# Altium footprint library INDUCTORS.PcbLib: 15 footprints
Each footprint in its own frame and in the unit in brackets; x right, y up, seen from the top. Pads: shape width x height; smd on the part's side, far side on the other; paste and mask are expansions set on the pad; w line width, h text height; cw(c..) or ccw(c..) is an arc to the next point about the centre after c.
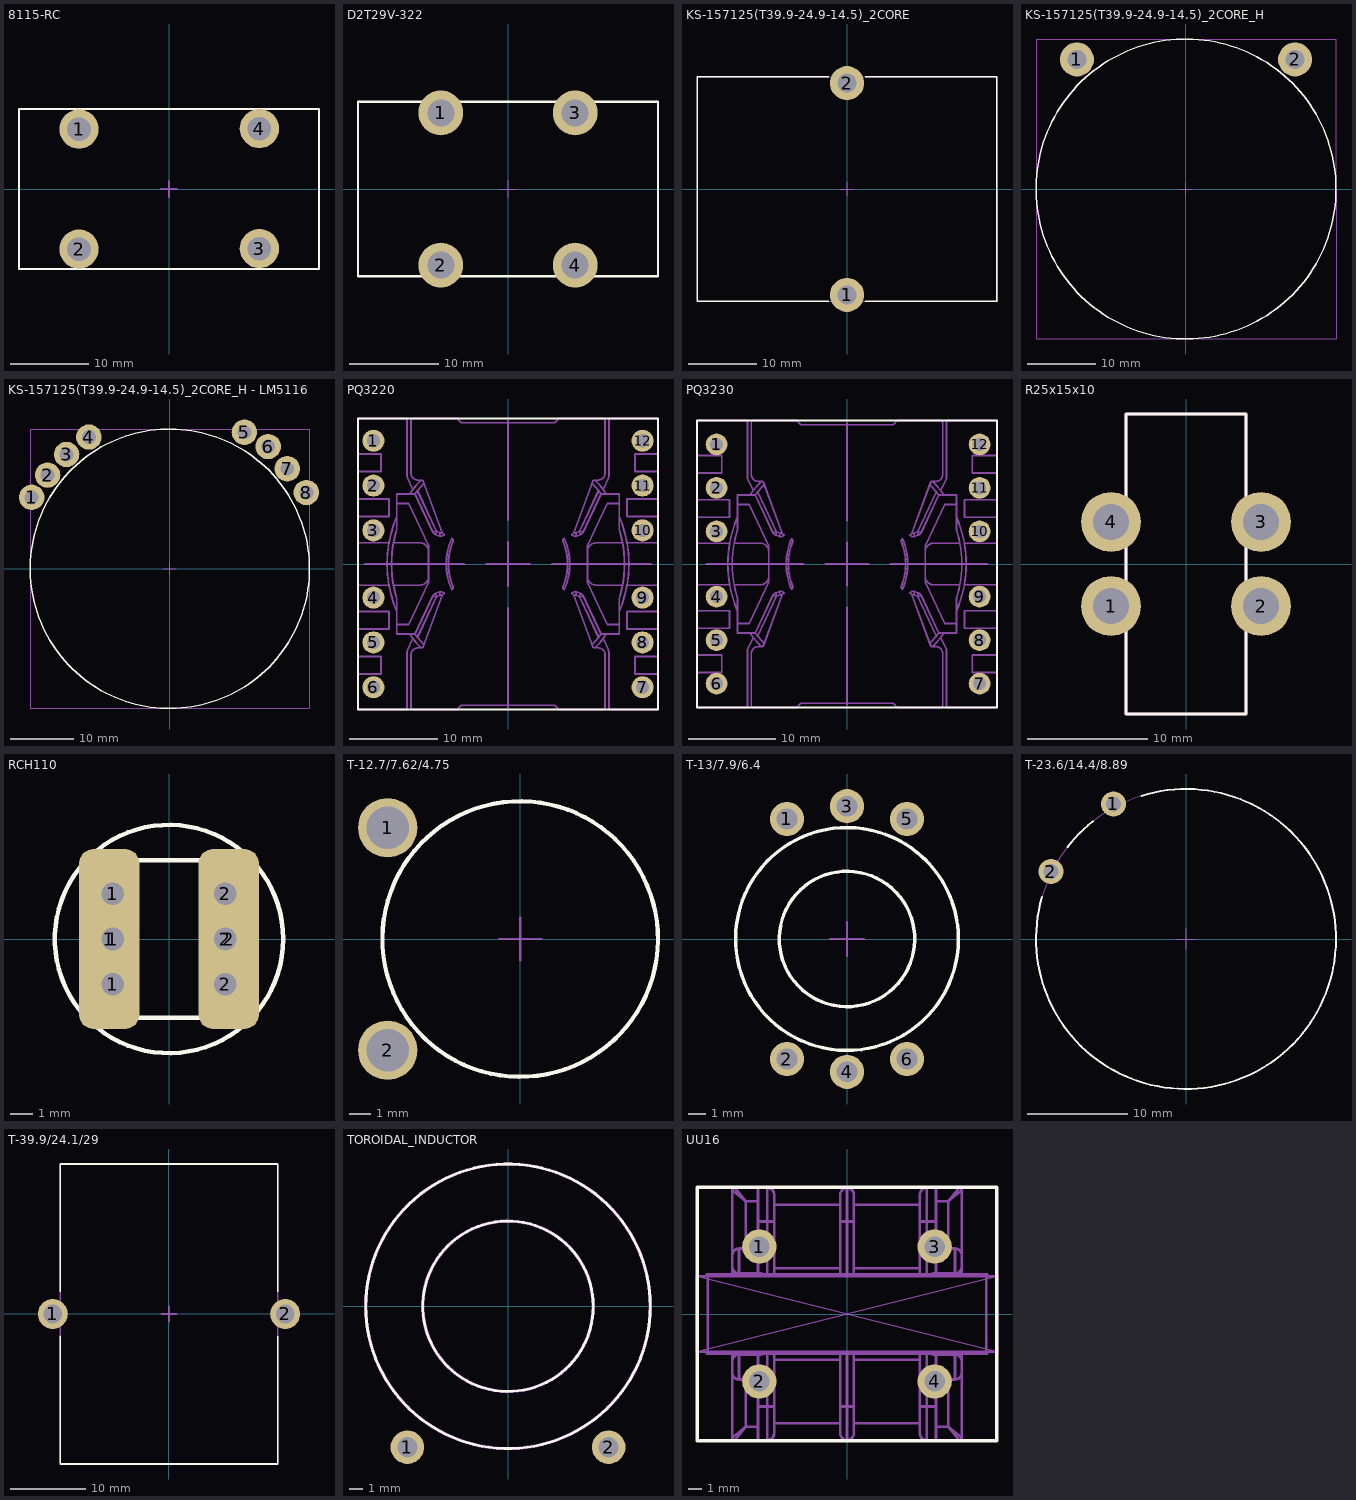
[diagram p0: the footprints below, top view; thin cyan lines are the x and y axes]

## 8115-RC [mm] "8115-RC"
height 10
pads (4):
  round 5 hole 3: 1(-11.43,7.62) 2(-11.43,-7.62) 3(11.484,-7.549) 4(11.484,7.691)
Top Overlay:
  lines w0.254: -19.05,-10.16 -19.05,10.16 19.05,10.16 19.05,-10.16 -19.05,-10.16
Top Assembly:
  lines w0.15: -19.05,-10.16 -19.05,10.16 19.05,10.16 19.05,-10.16 -19.05,-10.16
Top Component Outline (Mech15):
  lines w0.254: -1,0 1,0 ; 0,-1 0,1
3D body "8115RC_V2.STEP": height 38.89, standoff -5.06, extent -19.05,-10.16 19.05,10.16

## D2T29V-322 [mm] "D2T29V-322"
height 35
pads (4):
  round 5 hole 3: 1(-7.5,8.5) 2(-7.5,-8.5) 3(7.5,8.5) 4(7.5,-8.5)
Top Overlay:
  lines w0.254: -16.75,-9.75 16.75,-9.75 16.75,9.75 -16.75,9.75 -16.75,-9.75
Top Assembly:
  lines w0.1: -16.75,-9.75 16.75,-9.75 16.75,9.75 -16.75,9.75 -16.75,-9.75
Top Component Outline (Mech15):
  lines w0.1: -1,0 1,0 ; 0,-1 0,1
3D body "D2T29V-322.STEP": height 31.31, standoff 1.5, extent -16.152,-9.2 16.152,9.2

## KS-157125(T39.9-24.9-14.5)_2CORE [mm] "Дроссель  380мкГн(0А),180мкГн(11А), 2 сердечника, 34 витка, AWG12"
height 45
pads (2):
  round 5 hole 2.8: 1(0,-15.53) 2(0,15.53)
Top Overlay:
  lines w0.2: -2.7,-16.5 -22,-16.5 -22,16.5 -2.7,16.5 ; 2.7,-16.5 22,-16.5 22,16.5 2.7,16.5
Top Assembly:
  lines w0.1: -22,-16.5 -22,16.5 22,16.5 22,-16.5 -22,-16.5
Top Component Outline (Mech15):
  lines w0.1: -1,0 0,0 ; 0,-1 0,-0.5 0,0 ; 0,1 0,0 ; 1,0 0,0
3D body "KS-157125(T39.9-24.9-14.5)_2CORE.STEP": height 44.01, standoff -4.95, extent -21.916,-16.56 21.916,16.56

## KS-157125(T39.9-24.9-14.5)_2CORE_H [mm] "Дроссель  380мкГн(0А),180мкГн(11А), 2 сердечника, 34 витка, AWG12"
height 45
pads (2):
  round 5 hole 2.8: 1(-16,19) 2(16,19)
Top Overlay:
  circle w0.2: c0,0 r22
Top Assembly:
  lines w0.1: -22,-22 22,-22 22,22 -22,22 -22,-22
Top Component Outline (Mech15):
  lines w0.1: -1,0 0,0 ; 0,-1 0,-0.5 0,0 ; 0,1 0,0 ; 1,0 0,0
3D body "KS-157125(T39.9-24.9-14.5)_2CORE_H.STEP": height 33.56, standoff 0.44, extent -22.01,-21.916 22.01,21.916

## KS-157125(T39.9-24.9-14.5)_2CORE_H - LM5116 [mm] "Дроссель  380мкГн(0А),180мкГн(11А), 2 сердечника, 34 витка, AWG12"
height 45
pads (8):
  round 4 hole 2.2: 1(-21.75,11.25) 2(-19.25,14.75) 3(-16.25,18) 4(-12.75,20.75) 5(11.75,21.5) 6(15.5,19.25) 7(18.5,15.75) 8(21.5,12)
Top Overlay:
  circle w0.2: c0,0 r22
Top Assembly:
  lines w0.1: -22,-22 -22,22 22,22 22,-22 -22,-22
Top Component Outline (Mech15):
  lines w0.1: -1,0 0,0 ; 0,-1 0,-0.5 0,0 ; 0,1 0,0 ; 1,0 0,0
3D body "KS-157125(T39.9-24.9-14.5)_2CORE_H.STEP": height 33.56, standoff 0.44, extent -22.01,-21.916 22.01,21.916

## PQ3220 [mm]
pads (12):
  round 2.5 hole 1.5 paste-25.4: 1(-15.25,13.97) 2(-15.25,8.89) 3(-15.25,3.81) 4(-15.25,-3.81) 5(-15.25,-8.89) 6(-15.25,-13.97) 7(15.25,-13.97) 8(15.25,-8.89) 9(15.25,-3.81) 10(15.25,3.81) 11(15.25,8.89) 12(15.25,13.97)
Top Overlay:
  lines w0.2: -17,-16.5 17,-16.5 17,16.5 -17,16.5 -17,-16.5
Top Assembly:
  drawing of 220 lines, arcs and shapes, not listed
3D body "User Library-Transformer PQ3220.STEP": height 22.8, standoff -5.3, extent -17,-16.5 17,16.5

## PQ3230 [mm]
pads (12):
  round 2.5 hole 1.5 paste-25.4: 1(-15,13.75) 2(-15,8.75) 3(-15,3.75) 4(-15,-3.75) 5(-15,-8.75) 6(-15,-13.75) 7(15.25,-13.75) 8(15.25,-8.75) 9(15.25,-3.75) 10(15.25,3.75) 11(15.25,8.75) 12(15.25,13.75)
Top Overlay:
  lines w0.2: -17.25,-16.5 17.25,-16.5 17.25,16.5 -17.25,16.5 -17.25,-16.5
Top Assembly:
  drawing of 220 lines, arcs and shapes, not listed
3D body "User Library-PQ 32_30.step": height 32.9, standoff -4.9, extent -17.2,-16.5 17.2,16.5

## R25x15x10 [mm] "R25x15x10"
height 10
pads (4):
  round 5 hole 3: 1(-6.25,-3.5) 2(6.25,-3.5) 3(6.25,3.5) 4(-6.25,3.5)
Top Overlay:
  lines w0.254: -5,-12.5 5,-12.5 5,12.5 -5,12.5 -5,-12.5
Top Assembly:
  lines w0.254: -5,-12.5 -5,12.5 5,12.5 5,-12.5 -5,-12.5
3D body: height 25, standoff 0, extent -5,0.001 5,12.5
3D body: height 25, standoff 0, extent -5,-12.499 5,0

## RCH110 [mm]
height 10
pads (8):
  rrect50% 2.7x8 smd: 1(-2.65,0) 2(2.65,0)
  round 1.8 hole 1: 1(-2.5,-2) 1(-2.5,0) 1(-2.5,2) 2(2.5,-2) 2(2.5,0) 2(2.5,2)
Top Overlay:
  circle w0.2: c0,0 r5.062
  lines w0.2: -3.875,-0.5 -3.536,-0.5 ; -3.868,-0.499 ccw(c0,0) -1.744,-3.488 1.744,-3.488 ccw(c0,0) 3.868,-0.502 ; -3.868,0.502 cw(c0,0) -1.744,3.488 1.753,3.488 ; -3.85,0.5 -3.525,0.5 ; -3.5,-0.5 ccw(c-3.5,0) -3.5,0.5 ; 1.753,3.484 cw(c0,0) 3.864,0.527 ; 3.5,-0.5 cw(c3.5,0) 3.5,0.5 ; 3.525,-0.5 3.85,-0.5 ; 3.525,0.5 3.864,0.5
3D body "User Library-SDR0805.STEP": height 5.05, standoff 0, extent -3.679,-3.75 3.675,3.75
3D body "331KM35.STEP": height 10.3, standoff -2.5, extent -4.964,-5 4.964,5

## T-12.7/7.62/4.75 [mm]
height 35
pads (2):
  round 2.8 hole 2: 1(-6.25,5.25) 2(-6.25,-5.25)
Top Overlay:
  lines w0.2: -6.242,1.812 ccw(c0,0) -6.238,1.828
Top Assembly:
  circle w0.1: c0,0 r6.5
Top Component Outline (Mech15):
  lines w0.1: -1,0 0,0 ; 0,-1 0,-0.5 0,0 ; 0,1 0,0 ; 1,0 0,0
3D body "T12.7_7.62_4.75.STEP": height 4.75, standoff 0, extent -6.35,-6.35 6.35,6.35

## T-13/7.9/6.4 [mm]
height 35
pads (6):
  round 2 hole 1.2: 1(-3.5,7) 2(-3.5,-7) 3(0,7.75) 4(0,-7.75) 5(3.5,7) 6(3.5,-7)
Top Overlay:
  lines w0.2: -6.242,1.812 ccw(c0,0) -6.238,1.828 ; -3.793,1.101 ccw(c0,0) -3.791,1.111
Top Assembly:
  circle w0.1: c0,0 r3.95
  circle w0.1: c0,0 r6.5
Top Component Outline (Mech15):
  lines w0.1: -1,0 0,0 ; 0,-1 0,-0.5 0,0 ; 0,1 0,0 ; 1,0 0,0
3D body "Сердечник фильра.STEP": height 6.4, standoff 0, extent -6.5,-6.5 6.5,6.5

## T-23.6/14.4/8.89 [mm]
height 35
pads (2):
  round 2.5 hole 1.5: 1(-7.25,13.5) 2(-13.5,6.75)
Top Overlay:
  lines w0.2: -14.405,4.182 ccw(c0,0) -4.461,14.321 ; -11.853,9.192 cw(c0,0) -9.311,11.761
Top Assembly:
  circle w0.1: c0,0 r15
Top Component Outline (Mech15):
  lines w0.1: -1,0 0,0 ; 0,-1 0,-0.5 0,0 ; 0,1 0,0 ; 1,0 0,0
3D body "T23.6_14.4_8.89.STEP": height 8.89, standoff 0, extent -14.4,-14.4 14.4,14.4

## T-39.9/24.1/29 [mm]
pads (2):
  round 4 hole 2.5: 1(-15.5,0) 2(15.5,0)
Top Overlay:
  lines w0.254: -14.5,-3 -14.5,-20 14.5,-20 14.5,-3 ; -14.5,3 -14.5,20 14.5,20 14.5,3
Top Assembly:
  lines w0.2: -14.5,-20.002 0,-20.002 14.5,-20.002 14.5,20.001 0,20.001 ; -14.5,-20 -14.5,20.001 ; -14.5,20.001 ccw(c-14.5,20.001) -14.5,20.001 ; -14.5,20.001 0,20.001 ; 0,20.001 ccw(c0,20.001) 0,20.001 ; 0,20.001 0,20.001
Top Component Outline (Mech15):
  lines w0.254: -1,0 0,0 ; 0,-1 0,-0.5 0,0 ; 0,1 0,0 ; 1,0 0,0
3D body: height 40.5, standoff 0.5, extent 0,-20.002 14.5,20.001
3D body: height 40.5, standoff 0.5, extent -14.5,-20.002 0,20.001

## TOROIDAL_INDUCTOR [mm]
height 10
pads (2):
  round 2.5 hole 1.5: 1(-7.5,-10.5) 2(7.5,-10.5)
Top Overlay:
  circle w0.2: c0,0 r6.35
  circle w0.2: c0,0 r10.6
Top Assembly:
  circle w0.254: c0,0 r10.6
  circle w0.254: c0,0 r6.35
3D body "74270118.stp": height 6, standoff 0, extent -10.6,-10.6 10.6,10.6

## UU16 [mm]
pads (4):
  round 2.54 hole 1.524: 1(-6.5,5) 2(-6.5,-5) 3(6.5,5) 4(6.5,-5)
Top Overlay:
  lines w0.254: -11.1,-9.4 1.1,-9.4 11.1,-9.4 11.1,-0.2 11.1,9.4 -0.9,9.4 -11.1,9.4 -11.1,-9.4
Top Assembly:
  drawing of 156 lines, arcs and shapes, not listed
3D body "User Library-UU16.step": height 25.6, standoff -3.75, extent -11.117,-9.35 11.117,9.35